# Altium footprint library MYS-Library.PcbLib: 94 footprints (part 5 of 6)
Each footprint in its own frame and in the unit in brackets; x right, y up, seen from the top. Pads: shape width x height; smd on the part's side, far side on the other; paste and mask are expansions set on the pad; w line width, h text height; cw(c..) or ccw(c..) is an arc to the next point about the centre after c.
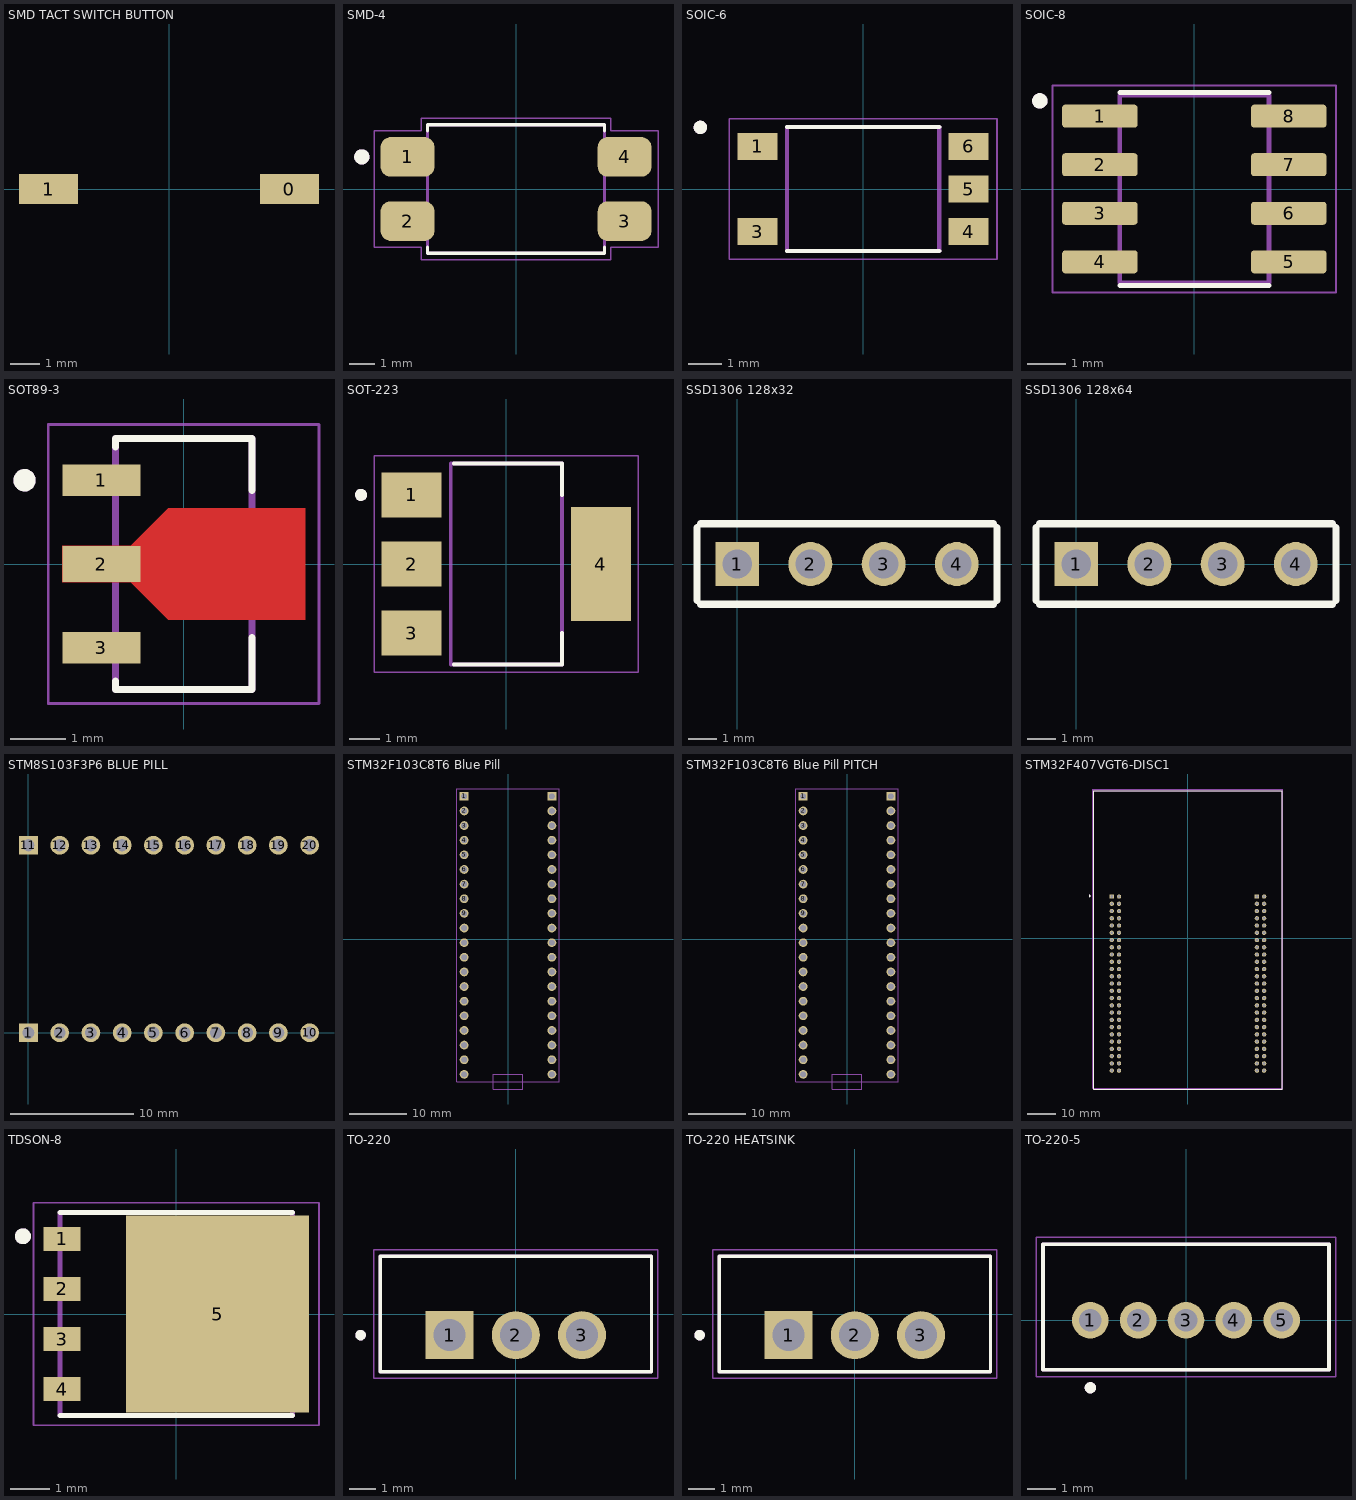
[diagram p4: the footprints below, top view; thin cyan lines are the x and y axes]

## SMD TACT SWITCH BUTTON [mm]
pads (2):
  rect 2x1 smd: 0(4.064,0) 1(-4.064,0)
3D body "Tactile_SMD_3x6x2.5mm.STEP": height 2.51, standoff 0, extent -4.026,-1.829 4.026,1.829

## SMD-4 [mm] "PC817 - SMD"
pads (4):
  rrect50% 2.13x1.57 smd: 1(-4.29,1.27) 2(-4.29,-1.27) 3(4.29,-1.27) 4(4.29,1.27)
Top Overlay:
  circle w0.3: c-6.1,1.27 r0.15
  lines w0.127: -3.5,-2.304 -3.5,-2.54 3.5,-2.54 3.5,-2.304 ; -3.5,2.304 -3.5,2.54 3.5,2.54 3.5,2.304
Mechanical 13:
  circle w0.3: c-6.1,1.27 r0.15
  lines w0.127: -3.5,-2.54 3.5,-2.54 3.5,2.54 -3.5,2.54 -3.5,-2.54
Mechanical 15:
  lines w0.05: -5.61,-2.31 -3.75,-2.31 -3.75,-2.79 3.75,-2.79 3.75,-2.31 5.61,-2.31 5.61,2.31 3.75,2.31 3.75,2.79 -3.75,2.79 -3.75,2.31 -5.61,2.31 -5.61,-2.31
3D body "step_temp.STEP": height 4, standoff 0, extent -4.875,-2.29 4.875,2.29

## SOIC-6 [mm]
pads (5):
  rect 1.2x0.8 smd: 1(-3.15,1.27) 3(-3.15,-1.27) 4(3.15,-1.27) 5(3.15,0) 6(3.15,1.27)
Top Overlay:
  circle w0.2: c-4.86,1.84 r0.1
  lines w0.127: -2.275,-1.85 2.275,-1.85 ; -2.275,1.85 2.275,1.85
Mechanical 13:
  circle w0.2: c-4.86,1.84 r0.1
  lines w0.127: -2.275,-1.85 2.275,-1.85 2.275,1.85 -2.275,1.85 -2.275,-1.85
Mechanical 15:
  lines w0.05: -4,-2.1 4,-2.1 4,2.1 -4,2.1 -4,-2.1
3D body "step_temp.STEP": height 2.3, standoff 0, extent -3.5,-1.85 3.5,1.85

## SOIC-8 [mm]
pads (8):
  rrect25% 1.97x0.6 smd: 1(-2.47,1.905) 2(-2.47,0.635) 3(-2.47,-0.635) 4(-2.47,-1.905) 5(2.47,-1.905) 6(2.47,-0.635) 7(2.47,0.635) 8(2.47,1.905)
Top Overlay:
  circle w0.2: c-4.04,2.305 r0.1
  lines w0.127: -1.95,-2.525 1.95,-2.525 ; -1.95,2.525 1.95,2.525
Mechanical 13:
  circle w0.2: c-4.04,2.305 r0.1
  lines w0.127: -1.95,-2.452 1.95,-2.452 1.95,2.452 -1.95,2.452 -1.95,-2.452
Mechanical 15:
  lines w0.05: -3.705,-2.702 3.705,-2.702 3.705,2.702 -3.705,2.702 -3.705,-2.702
3D body "THS4631D.STEP": height 1.75, standoff 0, extent -3,-2.45 3,2.45

## SOT89-3 [mm]
pads (3):
  rect 1.4x0.57 smd: 1(-1.475,1.5) 3(-1.475,-1.5)
  rect 1.4x0.65 smd paste-2 mask+0: 2(-1.475,0)
Top Layer:
  region: 2.175,-1 -0.275,-1 -0.95,-0.325 -2.175,-0.325 -2.175,0.325 -0.95,0.325 -0.275,1 2.175,1
Top Overlay:
  circle w0.2: c-2.85,1.5 r0.1
  lines w0.127: -1.222,-2.1 -1.222,-2.25 1.222,-2.25 1.222,-1.32 ; -1.222,2.1 -1.222,2.25 1.222,2.25 1.222,1.32
Top Paste:
  region: -0.95,-0.325 -2.175,-0.325 -2.175,0.325 -0.95,0.325
  region: 1.725,-0.633 0.175,-0.633 0.175,0.633 1.725,0.633
Top Solder:
  region: 2.275,-1.1 -0.375,-1.1 -1.05,-0.425 -2.275,-0.425 -2.275,0.425 -1.05,0.425 -0.375,1.1 2.275,1.1
Mechanical 13:
  circle w0.2: c-2.85,1.5 r0.1
  lines w0.127: -1.222,-2.25 1.222,-2.25 1.222,2.25 -1.222,2.25 -1.222,-2.25
Mechanical 15:
  lines w0.05: -2.425,-2.5 2.425,-2.5 2.425,2.5 -2.425,2.5 -2.425,-2.5
3D body "step_temp.STEP": height 1.6, standoff 0, extent -2.268,-2.25 1.827,2.25

## SOT-223 [mm]
pads (4):
  rect 2x1.5 smd: 1(-3.15,2.3) 2(-3.15,0) 3(-3.15,-2.3)
  rect 2x3.8 smd: 4(3.15,0)
Top Overlay:
  circle w0.2: c-4.836,2.3 r0.1
  lines w0.127: -1.75,-3.35 1.85,-3.35 1.85,-2.3 ; -1.75,3.35 1.85,3.35 1.85,2.3
Mechanical 13:
  circle w0.2: c-4.836,2.3 r0.1
  lines w0.127: -1.85,-3.35 1.85,-3.35 1.85,3.35 -1.85,3.35 -1.85,-3.35
Mechanical 15:
  lines w0.05: -4.4,-3.6 4.4,-3.6 4.4,3.6 -4.4,3.6 -4.4,-3.6
3D body "step_temp.STEP": height 1.8, standoff 0, extent -3.5,-3.225 3.5,3.225

## SSD1306 128x32 [mil]
pads (4):
  rect 60x60 hole 40.16: 1(0,0)
  round 60 hole 40.16: 2(100,0) 3(200,0) 4(300,0)
Top Overlay:
  lines w10: -55,-50 -55,50 ; -50,-55 350,-55 ; -50,55 350,55 ; 355,-50 355,50
3D body "OLED_0.91_128x32.stp": height 256.3, standoff -194.88, extent -88.19,-1452.87 388.19,55
3D body "4-Pin Header - Female - 2.54mm.step": height 196.85, standoff -118.11, extent -59.84,-49.21 359.84,49.21

## SSD1306 128x64 [mil]
pads (4):
  rect 60x60 hole 40.16: 1(0,0)
  round 60 hole 40.16: 2(100,0) 3(200,0) 4(300,0)
Top Overlay:
  lines w10: -55,-50 -55,50 ; -50,-55 350,-55 ; -50,55 350,55 ; 355,-50 355,50
3D body "4-Pin Header - Female - 2.54mm.step": height 196.85, standoff -118.11, extent -59.84,-49.21 359.84,49.21
3D body "OLED-128x64-0.96.step": height 392.63, standoff -34.37, extent -376.18,-1006.85 675,90

## STM8S103F3P6 BLUE PILL [mil]
pads (20):
  rect 60x60 hole 36 slot 37.8 at 90 deg: 1(0,0) 11(0,600)
  round 60 hole 36 slot 37.8 at 90 deg: 2(100,0) 3(200,0) 4(300,0) 5(400,0) 6(500,0) 7(600,0) 8(700,0) 9(800,0) 10(900,0) 12(100,600) 13(200,600) 14(300,600) 15(400,600) 16(500,600) 17(600,600) 18(700,600) 19(800,600) 20(900,600)
3D body "STM8S103F3P6 Dev board.STEP": height 515.75, standoff -220.47, extent -55.55,-64.17 1125.55,664.17

## STM32F103C8T6 Blue Pill [mil]
pads (40):
  rect 60x60 hole 36 slot 37.8 at 0 deg: 1(-300,975) 40(300,975)
  round 60 hole 36 slot 37.8 at 0 deg: 2(-300,875) 3(-300,775) 4(-300,675) 5(-300,575) 6(-300,475) 7(-300,375) 8(-300,275) 9(-300,175) 10(-300,75) 11(-300,-25) 12(-300,-125) 13(-300,-225) 14(-300,-325) 15(-300,-425) 16(-300,-525) 17(-300,-625) 18(-300,-725) 19(-300,-825) 20(-300,-925) 21(300,-925) 22(300,-825) 23(300,-725) 24(300,-625) 25(300,-525) 26(300,-425) 27(300,-325) 28(300,-225) 29(300,-125) 30(300,-25) 31(300,75) 32(300,175) 33(300,275) 34(300,375) 35(300,475) 36(300,575) 37(300,675) 38(300,775) 39(300,875)
Mechanical 15:
  lines w5: -350,-975 350,-975 350,1025 -350,1025 -350,-975 ; -100,-1025 100,-1025 100,-925 -100,-925 -100,-1025
3D body "YAAJ_BluePill_PinHeaders_H_SWD_cp.step": height 545.43, standoff -108.11, extent -445,-1019.13 444.76,1139.13

## STM32F103C8T6 Blue Pill PITCH [mil]
pads (40):
  rect 60x60 hole 36 slot 37.8 at 0 deg: 1(-300,975) 40(300,975)
  round 60 hole 36 slot 37.8 at 0 deg: 2(-300,875) 3(-300,775) 4(-300,675) 5(-300,575) 6(-300,475) 7(-300,375) 8(-300,275) 9(-300,175) 10(-300,75) 11(-300,-25) 12(-300,-125) 13(-300,-225) 14(-300,-325) 15(-300,-425) 16(-300,-525) 17(-300,-625) 18(-300,-725) 19(-300,-825) 20(-300,-925) 21(300,-925) 22(300,-825) 23(300,-725) 24(300,-625) 25(300,-525) 26(300,-425) 27(300,-325) 28(300,-225) 29(300,-125) 30(300,-25) 31(300,75) 32(300,175) 33(300,275) 34(300,375) 35(300,475) 36(300,575) 37(300,675) 38(300,775) 39(300,875)
Mechanical 15:
  lines w5: -350,-975 350,-975 350,1025 -350,1025 -350,-975 ; -100,-1025 100,-1025 100,-925 -100,-925 -100,-1025
3D body "SCLM-40.step": height 106.3, standoff -185.04, extent -350,-975 350,1025
3D body "YAAJ_BluePill_PinHeaders_H_SWD_cp.step": height 702.91, standoff 49.37, extent -445,-1019.13 444.76,1139.13

## STM32F407VGT6-DISC1 [mm]
pads (100):
  rect 1.508x1.508 hole 1: P1_1(-26.67,14.68) P2_1(24.13,14.68)
  round 1.508 hole 1: P1_2(-24.13,14.68) P1_3(-26.67,12.14) P1_4(-24.13,12.14) P1_5(-26.67,9.6) P1_6(-24.13,9.6) P1_7(-26.67,7.06) P1_8(-24.13,7.06) P1_9(-26.67,4.52) P1_10(-24.13,4.52) P1_11(-26.67,1.98) P1_12(-24.13,1.98) P1_13(-26.67,-0.56) P1_14(-24.13,-0.56) P1_15(-26.67,-3.1) P1_16(-24.13,-3.1) P1_17(-26.67,-5.64) P1_18(-24.13,-5.64) P1_19(-26.67,-8.18) P1_20(-24.13,-8.18) P1_21(-26.67,-10.72) P1_22(-24.13,-10.72) P1_23(-26.67,-13.26) P1_24(-24.13,-13.26) P1_25(-26.67,-15.8) P1_26(-24.13,-15.8) P1_27(-26.67,-18.34) P1_28(-24.13,-18.34) P1_29(-26.67,-20.88) P1_30(-24.13,-20.88) P1_31(-26.67,-23.42) P1_32(-24.13,-23.42) P1_33(-26.67,-25.96) P1_34(-24.13,-25.96) P1_35(-26.67,-28.5) P1_36(-24.13,-28.5) P1_37(-26.67,-31.04) P1_38(-24.13,-31.04) P1_39(-26.67,-33.58) P1_40(-24.13,-33.58) P1_41(-26.67,-36.12) P1_42(-24.13,-36.12) P1_43(-26.67,-38.66) P1_44(-24.13,-38.66) P1_45(-26.67,-41.2) P1_46(-24.13,-41.2) P1_47(-26.67,-43.74) P1_48(-24.13,-43.74) P1_49(-26.67,-46.28) P1_50(-24.13,-46.28) P2_2(26.67,14.68) P2_3(24.13,12.14) P2_4(26.67,12.14) P2_5(24.13,9.6) P2_6(26.67,9.6) P2_7(24.13,7.06) P2_8(26.67,7.06) P2_9(24.13,4.52) P2_10(26.67,4.52) P2_11(24.13,1.98) P2_12(26.67,1.98) P2_13(24.13,-0.56) P2_14(26.67,-0.56) P2_15(24.13,-3.1) P2_16(26.67,-3.1) P2_17(24.13,-5.64) P2_18(26.67,-5.64) P2_19(24.13,-8.18) P2_20(26.67,-8.18) P2_21(24.13,-10.72) P2_22(26.67,-10.72) P2_23(24.13,-13.26) P2_24(26.67,-13.26) P2_25(24.13,-15.8) P2_26(26.67,-15.8) P2_27(24.13,-18.34) P2_28(26.67,-18.34) P2_29(24.13,-20.88) P2_30(26.67,-20.88) P2_31(24.13,-23.42) P2_32(26.67,-23.42) P2_33(24.13,-25.96) P2_34(26.67,-25.96) P2_35(24.13,-28.5) P2_36(26.67,-28.5) P2_37(24.13,-31.04) P2_38(26.67,-31.04) P2_39(24.13,-33.58) P2_40(26.67,-33.58) P2_41(24.13,-36.12) P2_42(26.67,-36.12) P2_43(24.13,-38.66) P2_44(26.67,-38.66) P2_45(24.13,-41.2) P2_46(26.67,-41.2) P2_47(24.13,-43.74) P2_48(26.67,-43.74) P2_49(24.13,-46.28) P2_50(26.67,-46.28)
Top Overlay:
  circle w0.4: c-34.41,14.88 r0.2
  lines w0.127: -33,-52.705 -33,51.689 33,51.689 33,-52.705 -33,-52.705
Mechanical 13:
  circle w0.4: c-34.41,14.88 r0.2
  lines w0.127: -33,-52.705 33,-52.705 33,51.689 -33,51.689 -33,-52.705
Mechanical 15:
  lines w0.05: -33.25,-52.451 -33.25,52.324 33.25,52.324 33.25,-52.451 -33.25,-52.451
3D body "STM32F4DISCOVERY--3DModel-STEP-56544.STEP": height 16.9, standoff -6, extent -33.02,-51.943 32.98,50.357

## TDSON-8 [mm]
pads (5):
  rect 0.95x0.6 smd paste-1 mask+0: 1(-2.9,1.905) 2(-2.9,0.635) 3(-2.9,-0.635) 4(-2.9,-1.905)
  rect 4.65x5 smd paste-3 mask+0: 5(1.05,0)
Top Overlay:
  circle w0.2: c-3.892,1.973 r0.1
  lines w0.127: -2.95,-2.575 2.95,-2.575 ; -2.95,2.575 2.95,2.575
Top Paste:
  region: -2.53,1.7 -3.28,1.7 -3.28,2.1 -2.53,2.1
  region: -2.53,0.435 -3.28,0.435 -3.28,0.837 -2.53,0.837
  region: -2.53,-0.835 -3.28,-0.835 -3.28,-0.436 -2.53,-0.436
  region: -2.53,-2.105 -3.28,-2.105 -3.28,-1.708 -2.53,-1.708
  region: 0.55,0.1 -0.95,0.1 -0.95,1.6 0.55,1.6
  region: 0.55,-1.6 -0.95,-1.6 -0.95,-0.1 0.55,-0.1
  region: 2.25,0.1 0.75,0.1 0.75,1.6 2.25,1.6
  region: 2.25,-1.6 0.75,-1.6 0.75,-0.1 2.25,-0.1
  region: 3.28,1.655 2.53,1.655 2.53,2.155 3.28,2.155
  region: 3.28,0.385 2.53,0.385 2.53,0.885 3.28,0.885
  region: 3.28,-0.885 2.53,-0.885 2.53,-0.385 3.28,-0.385
  region: 3.28,-2.155 2.53,-2.155 2.53,-1.655 3.28,-1.655
Top Solder:
  region: 3.325,1.605 2.525,1.605 2.525,0.935 3.325,0.935 3.325,0.335 2.525,0.335 2.525,-0.335 3.325,-0.335 3.325,-0.935 2.525,-0.935 2.525,-1.605 3.325,-1.605 3.325,-2.205 -1.225,-2.205 -1.225,2.205 3.325,2.205
  region: -2.475,-2.155 -3.325,-2.155 -3.325,-1.655 -2.475,-1.655
  region: -2.475,-0.885 -3.325,-0.885 -3.325,-0.385 -2.475,-0.385
  region: -2.475,0.385 -3.325,0.385 -3.325,0.885 -2.475,0.885
  region: -2.475,1.655 -3.325,1.655 -3.325,2.155 -2.475,2.155
Mechanical 13:
  circle w0.2: c-3.892,1.973 r0.1
  lines w0.127: -2.95,-2.575 2.95,-2.575 2.95,2.575 -2.95,2.575 -2.95,-2.575
Mechanical 15:
  lines w0.05: -3.625,-2.825 3.625,-2.825 3.625,2.825 -3.625,2.825 -3.625,-2.825
3D body "BSC050NE2LS.STEP": height 1.1, standoff 0, extent -3.075,-2.575 3.075,2.575

## TO-220 [mm]
pads (3):
  rect 1.845x1.845 / inner round 1.845 / far side rect 1.845x1.845 hole 1.23: 1(-2.54,-0.81)
  round 1.845 hole 1.23: 2(0,-0.81) 3(2.54,-0.81)
Top Overlay:
  circle w0.2: c-5.957,-0.81 r0.1
  lines w0.127: -5.208,-2.222 5.208,-2.222 5.208,2.222 -5.208,2.222 -5.208,-2.222
Mechanical 13:
  circle w0.2: c-5.957,-0.81 r0.1
  lines w0.127: -5.208,-2.222 5.208,-2.222 5.208,2.222 -5.208,2.222 -5.208,-2.222
Mechanical 15:
  lines w0.05: -5.457,-2.472 -5.457,2.472 5.457,2.472 5.457,-2.472 -5.457,-2.472
3D body "IRLB3034PBF.STEP": height 19.3, standoff -10.03, extent -5.207,-2.222 5.207,2.223

## TO-220 HEATSINK [mm]
pads (3):
  rect 1.845x1.845 / inner round 1.845 / far side rect 1.845x1.845 hole 1.23: 1(-2.54,-0.81)
  round 1.845 hole 1.23: 2(0,-0.81) 3(2.54,-0.81)
Top Overlay:
  circle w0.2: c-5.957,-0.81 r0.1
  lines w0.127: -5.208,-2.222 5.208,-2.222 5.208,2.222 -5.208,2.222 -5.208,-2.222
Mechanical 13:
  circle w0.2: c-5.957,-0.81 r0.1
  lines w0.127: -5.208,-2.222 5.208,-2.222 5.208,2.222 -5.208,2.222 -5.208,-2.222
Mechanical 15:
  lines w0.05: -5.457,-2.472 -5.457,2.472 5.457,2.472 5.457,-2.472 -5.457,-2.472
3D body "IRLB3034PBF.STEP": height 22.3, standoff -7.03, extent -5.207,-2.222 5.207,2.223
3D body "TO220 Heatsink.STEP": height 23, standoff 2, extent -7.507,-4.539 7.493,5.461

## TO-220-5 [mm]
pads (5):
  round 1.3 hole 0.8: 1(-3.4,0) 2(-1.7,0) 3(0,0) 4(1.7,0) 5(3.4,0)
Top Overlay:
  circle w0.2: c-3.4,-2.4 r0.1
  lines w0.127: -5.08,-1.753 5.08,-1.753 5.08,2.692 -5.08,2.692 -5.08,-1.753
Mechanical 13:
  circle w0.2: c-3.4,-2.4 r0.1
  lines w0.127: -5.08,-1.753 5.08,-1.753 5.08,2.692 -5.08,2.692 -5.08,-1.753
Mechanical 15:
  lines w0.05: -5.33,-2.003 5.33,-2.003 5.33,2.942 -5.33,2.942 -5.33,-2.003
3D body "step_temp.STEP": height 19.51, standoff -11.99, extent -5.08,-1.48 5.08,2.711